# Altium footprint library Connectors.PcbLib: 122 footprints (part 2 of 8)
Each footprint in its own frame and in the unit in brackets; x right, y up, seen from the top. Pads: shape width x height; smd on the part's side, far side on the other; paste and mask are expansions set on the pad; w line width, h text height; cw(c..) or ccw(c..) is an arc to the next point about the centre after c.
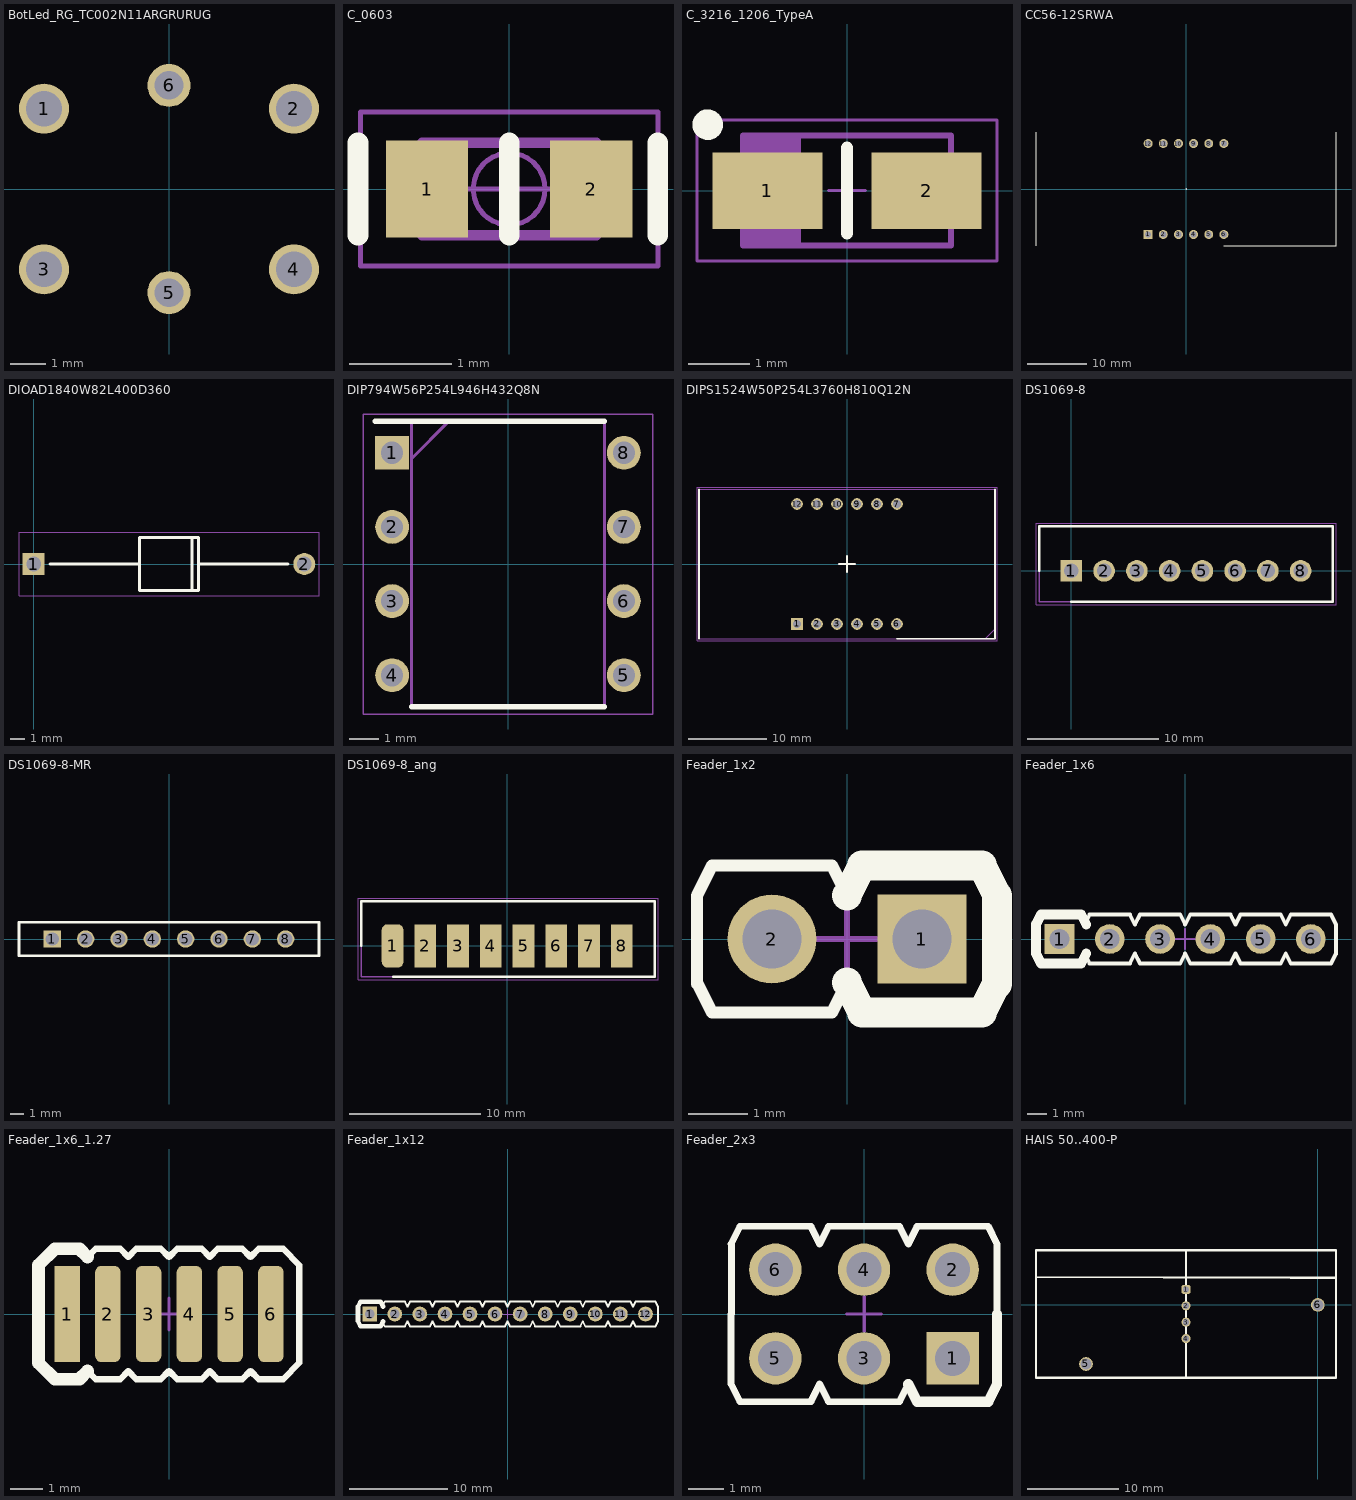
[diagram p1: the footprints below, top view; thin cyan lines are the x and y axes]

## BotLed_RG_TC002N11ARGRURUG [mm]
pads (6):
  round 1.401 hole 1: 1(-3.5,2.25) 2(3.5,2.25) 3(-3.5,-2.25) 4(3.5,-2.25)
  round 1.201 hole 0.8: 5(0,-2.9) 6(0,2.9)
3D body "TC002N11ARGRURUG.STEP": height 7.7, standoff -3.5, extent -5,-5 5,5

## C_0603 [mm] "Chip Capacitor, Body 1.0x0.55mm, IPC Medium Density"
height 0.5
pads (2):
  rect 0.8x0.95 smd: 1(-0.8,0) 2(0.8,0)
Top Overlay:
  lines w0.2: -1.473,-0.45 -1.473,0.45 ; 0,-0.45 0,0.45 ; 1.448,-0.45 1.448,0.45
Mechanical 14:
  lines w0.1: -0.85,-0.45 0.85,-0.45 0.85,0.45 -0.85,0.45 -0.85,-0.45
Mechanical 15:
  circle w0.05: c0,0 r0.35
  lines w0.05: -0.5,0 0.5,0 ; 0,-0.5 0,0.5 ; -1.45,-0.75 1.45,-0.75 1.45,0.75 -1.45,0.75 -1.45,-0.75
3D body "CAPC1608X100N.stp": height 1, standoff 0, extent -0.85,-0.45 0.85,0.45

## C_3216_1206_TypeA [mm] "Capacitor, Polarized, Molded  Body 3.2x1.6mm, IPC Medium Density"
height 1.8
pads (2):
  rect 1.8x1.25 smd: 1(-1.3,0) 2(1.3,0)
Top Overlay:
  circle w0.25: c-2.275,1.075 r0.125
  lines w0.2: 0,-0.7 0,0.7
Mechanical 14:
  lines w0.1: -1.625,-0.9 -1.625,0.9 ; -1.55,-0.9 -1.55,0.9 ; -1.475,-0.9 -1.475,0.9 ; -1.4,-0.9 -1.4,0.9 ; -1.325,-0.9 -1.325,0.9 ; -1.25,-0.9 -1.25,0.9 ; -1.175,-0.9 -1.175,0.9 ; -1.1,-0.9 -1.1,0.9 ; -1.025,-0.9 -1.025,0.9 ; -0.95,-0.9 -0.95,0.9 ; -0.875,-0.9 -0.875,0.9 ; -1.7,-0.9 1.7,-0.9 1.7,0.9 -1.7,0.9 -1.7,-0.9 ; -0.8,-0.9 -0.8,0.9 -0.8,-0.9
Mechanical 15:
  lines w0.05: -0.3,0 0.3,0 ; 0,-0.3 0,0.3 ; -2.45,-1.15 -2.45,1.15 2.45,1.15 2.45,-1.15 -2.45,-1.15
3D body "CAPMP3216X180N.stp": height 1.6, standoff 0, extent -1.7,-0.9 1.7,0.9

## CC56-12SRWA [mm] "Индикатор 14.2мм 4х7 красный ОК, 24мКд"
height 8.1
pads (12):
  rect 1.5x1.5 hole 1: 1(-6.35,-7.62)
  round 1.5 hole 1: 2(-3.81,-7.62) 3(-1.27,-7.62) 4(1.27,-7.62) 5(3.81,-7.62) 6(6.35,-7.62) 7(6.35,7.62) 8(3.81,7.62) 9(1.27,7.62) 10(-1.27,7.62) 11(-3.81,7.62) 12(-6.35,7.62)
Top Overlay:
  lines w0.2: -25.15,-9.5 -25.15,9.5 ; 6.35,-9.5 25.146,-9.5 25.146,9.5
  lines w0.254: 0,-0.01 0,0.01
3D body: height 0.25, standoff 0, extent -2.75,8.75 -2.75,8.75
3D body "CC56-12SRWA.STEP": height 8.1, standoff -1.5, extent -25.15,-9.5 25.15,9.5

## DIOAD1840W82L400D360 [mm]
pads (2):
  rect 1.5x1.5 hole 1: 1(0,0)
  round 1.5 hole 1: 2(18.4,0)
Top Overlay:
  lines w0.2: 1.1,0 7.2,0 ; 10.767,-1.8 10.767,1.8 ; 11.2,0 17.3,0 ; 7.2,-1.8 7.2,1.8 11.2,1.8 11.2,-1.8 7.2,-1.8
Mechanical 15:
  lines w0.05: -1,-2.15 -1,2.15 19.4,2.15 19.4,-2.15 -1,-2.15
3D body "BYV26C-TAP.stp": height 3.6, standoff -3.6, extent -0.408,-1.8 18.808,1.8

## DIP794W56P254L946H432Q8N [mm]
pads (8):
  rect 1.16x1.16 hole 0.76: 1(-3.97,3.81)
  round 1.16 hole 0.76: 2(-3.97,1.27) 3(-3.97,-1.27) 4(-3.97,-3.81) 5(3.97,-3.81) 6(3.97,-1.27) 7(3.97,1.27) 8(3.97,3.81)
Top Overlay:
  lines w0.2: -4.55,4.89 3.3,4.89 ; -3.3,-4.89 3.3,-4.89
Mechanical 13:
  lines w0.1: -3.3,3.62 -2.03,4.89 ; -3.3,-4.89 -3.3,4.89 3.3,4.89 3.3,-4.89 -3.3,-4.89
Mechanical 15:
  lines w0.05: -4.96,-5.14 -4.96,5.14 4.96,5.14 4.96,-5.14 -4.96,-5.14
3D body "MCP2551-E_P.stp": height 4.32, standoff -3.5, extent -4.11,-4.73 4.11,4.73

## DIPS1524W50P254L3760H810Q12N [mm]
pads (12):
  rect 1.5x1.5 hole 1: 1(-6.35,-7.62)
  round 1.5 hole 1: 2(-3.81,-7.62) 3(-1.27,-7.62) 4(1.27,-7.62) 5(3.81,-7.62) 6(6.35,-7.62) 7(6.35,7.62) 8(3.81,7.62) 9(1.27,7.62) 10(-1.27,7.62) 11(-3.81,7.62) 12(-6.35,7.62)
Top Overlay:
  lines w0.2: -18.8,-9.5 -18.8,9.5 ; 6.35,-9.5 18.8,-9.5 18.8,9.5
  lines w0.254: -1,0 1,0 ; 0,-1 0,1
Mechanical 13:
  lines w0.1: 17.53,-9.5 18.8,-8.23 ; -18.8,-9.5 18.8,-9.5 18.8,9.5 -18.8,9.5 -18.8,-9.5
Mechanical 15:
  lines w0.05: -19.05,-9.75 -19.05,9.75 19.05,9.75 19.05,-9.75 -19.05,-9.75
3D body: height 8.1, standoff 0, extent -18.796,-9.5 18.796,9.5

## DS1069-8 [mm]
pads (8):
  rect 1.65x1.65 hole 1.1: 1(0,0)
  round 1.65 hole 1.1: 2(2.5,0) 3(5,0) 4(7.5,0) 5(10,0) 6(12.5,0) 7(15,0) 8(17.5,0)
Top Overlay:
  lines w0.2: -2.45,0 -2.45,3.4 19.95,3.4 19.95,-2.35 0,-2.35
Mechanical 13:
  lines w0.1: -2.45,-2.35 -2.45,3.4 19.95,3.4 19.95,-2.35 -2.45,-2.35
Mechanical 15:
  lines w0.05: -2.7,-2.6 -2.7,3.65 20.2,3.65 20.2,-2.6 -2.7,-2.6
3D body "DS1069-8.stp": height 7.05, standoff -3.35, extent -2.45,-2.875 19.95,2.875

## DS1069-8-MR [mm]
pads (8):
  rect 1.301x1.301 hole 1: 1(-8.75,0)
  round 1.301 hole 1: 2(-6.25,0) 3(-3.75,0) 4(-1.25,0) 5(1.25,0) 6(3.75,0) 7(6.25,0) 8(8.75,0)
Top Overlay:
  lines w0.2: -11.25,-1.25 11.25,-1.25 11.25,1.25 -11.25,1.25 -11.25,-1.25
3D body "DS1069-8-MR.STEP": height 5.8, standoff -3.35, extent -11.2,-7.32 11.2,0.32

## DS1069-8_ang [mm]
pads (8):
  rrect50% 1.65x3.3 / inner rect 1.65x1.65 / far side rect 0x0 all layers, no hole: 1(-8.75,0)
  rect 1.65x3.3 / inner rect 1.65x3.3 / far side round 0 all layers, no hole: 2(-6.25,0)
  rect 1.65x3.3 / inner rect 1.65x3.3 / far side rect 0x0 all layers, no hole: 3(-3.75,0) 4(-1.25,0) 5(1.25,0) 6(3.75,0) 7(6.25,0) 8(8.75,0)
Top Overlay:
  lines w0.2: -11.137,0 -11.137,3.4 11.263,3.4 11.263,-2.35 -8.687,-2.35
Mechanical 13:
  lines w0.1: -11.137,-2.35 11.263,-2.35 11.263,3.4 -11.137,3.4 -11.137,-2.35
Mechanical 15:
  lines w0.05: -11.387,-2.6 11.513,-2.6 11.513,3.65 -11.387,3.65 -11.387,-2.6
3D body "DS1069-8.stp": height 3.37, standoff -2.38, extent -11.2,-9.5 11.2,0.9

## Feader_1x2 [mm] "4 Contacts - Pitch 2.54mm - Dual Row Through Mount Straight Header (Post Lead = 6.35mm, Tail Lead 3.05mm, Insulator 1.52mm)"
pads (2):
  rect 1.5x1.5 hole 1: 1(1.27,0)
  round 1.5 hole 1: 2(-1.27,0)
Top Overlay:
  lines w0.2: -2.54,-0.762 -2.54,0.737 -2.286,1.245 -0.254,1.245 0,0.737 ; -2.54,-0.737 -2.286,-1.245 -0.254,-1.245 0,-0.737 ; 0.254,1.245 2.286,1.245 ; 2.54,-0.762 2.54,0.737
  lines w0.5: 0,-0.737 0.254,-1.245 2.286,-1.245 2.54,-0.737 ; 0,0.737 0.254,1.245 2.286,1.245 2.54,0.737 2.54,-0.762
Mechanical 8:
  lines w0.1: -0.5,0 0,0 ; 0,-0.5 0,0 ; 0,0.5 0,0 ; 0.5,0 0,0
Mechanical 14:
  lines w0.1: -2.54,-0.762 -2.54,0.737 -2.286,1.245 -0.254,1.245 0,0.737 0.254,1.245 2.286,1.245 2.54,0.737 2.54,-0.762 ; -2.54,-0.737 -2.286,-1.245 -0.254,-1.245 0,-0.737 0.254,-1.245 2.286,-1.245 2.54,-0.737

## Feader_1x6 [mm] "6 Contacts - Pitch 2.54mm - Dual Row Through Mount Straight Header (Post Lead = 6.35mm, Tail Lead 3.05mm, Insulator 1.52mm)"
pads (6):
  rect 1.5x1.5 hole 1: 1(-6.35,0)
  round 1.5 hole 1: 2(-3.81,0) 3(-1.27,0) 4(1.27,0) 5(3.81,0) 6(6.35,0)
Top Overlay:
  lines w0.2: -5.08,-0.737 -4.826,-1.245 -2.794,-1.245 -2.54,-0.737 -2.286,-1.245 -0.254,-1.245 0,-0.737 0.254,-1.245 2.286,-1.245 2.54,-0.737 2.794,-1.245 4.826,-1.245 5.08,-0.737 5.334,-1.245 7.366,-1.245 7.62,-0.737 ; -5.08,0.737 -4.826,1.245 -2.794,1.245 -2.54,0.737 -2.286,1.245 -0.254,1.245 0,0.737 0.254,1.245 2.286,1.245 2.54,0.737 2.794,1.245 4.826,1.245 5.08,0.737 5.334,1.245 7.366,1.245 7.62,0.737 7.62,-0.762
  lines w0.5: -7.54,0.737 -7.286,1.245 -5.254,1.245 -5,0.737 ; -7.54,0.762 -7.54,-0.737 -7.286,-1.245 -5.254,-1.245 -5,-0.737
Mechanical 8:
  lines w0.1: -0.5,0 0,0 ; 0,-0.5 0,0 ; 0,0.5 0,0 ; 0.5,0 0,0

## Feader_1x6_1.27 [mm] "6 Contacts - Pitch 1.27mm - Dual Row Through Mount Straight Header (Post Lead = 6.35mm, Tail Lead 3.05mm, Insulator 1.52mm)"
pads (6):
  rect 0.8x3 smd: 1(-3.175,0)
  rrect50% 0.8x3 smd: 2(-1.905,0) 3(-0.635,0) 4(0.635,0) 5(1.905,0) 6(3.175,0)
Top Overlay:
  lines w0.2: -2.54,-1.778 -2.286,-2.032 -1.524,-2.032 -1.27,-1.778 -1.016,-2.032 -0.254,-2.032 0,-1.778 0.254,-2.032 1.016,-2.032 1.27,-1.778 1.524,-2.032 2.286,-2.032 2.54,-1.778 2.794,-2.032 3.556,-2.032 4.064,-1.524 4.064,0 4.064,1.524 3.556,2.032 2.794,2.032 2.54,1.778 2.286,2.032 1.524,2.032 1.27,1.778 1.016,2.032 0.254,2.032 0,1.778 -0.254,2.032 -1.016,2.032 -1.27,1.778 -1.524,2.032 -2.286,2.032 -2.54,1.778
  lines w0.4: -2.54,-1.778 -2.794,-2.032 -3.556,-2.032 -4.064,-1.524 -4.064,0 -4.064,1.524 -3.556,2.032 -2.794,2.032 -2.54,1.778
Mechanical 8:
  lines w0.1: 0,0.5 0,0 ; 0,0 0.5,0 0,0 ; 0,0 0,-0.5 0,0 ; 0,0 -0.5,0 0,0

## Feader_1x12 [mm] "6 Contacts - Pitch 2.54mm - Dual Row Through Mount Straight Header (Post Lead = 6.35mm, Tail Lead 3.05mm, Insulator 1.52mm)"
pads (12):
  rect 1.5x1.5 hole 1: 1(-13.97,0)
  round 1.5 hole 1: 2(-11.43,0) 3(-8.89,0) 4(-6.35,0) 5(-3.81,0) 6(-1.27,0) 7(1.27,0) 8(3.81,0) 9(6.35,0) 10(8.89,0) 11(11.43,0) 12(13.97,0)
Top Overlay:
  lines w0.2: -12.7,-0.737 -12.446,-1.245 -10.414,-1.245 -10.16,-0.737 -9.906,-1.245 -7.874,-1.245 -7.62,-0.737 -7.366,-1.245 -5.334,-1.245 -5.08,-0.737 -4.826,-1.245 -2.794,-1.245 -2.54,-0.737 -2.286,-1.245 -0.254,-1.245 0,-0.737 0.254,-1.245 2.286,-1.245 2.54,-0.737 2.794,-1.245 4.826,-1.245 5.08,-0.737 5.334,-1.245 7.366,-1.245 7.62,-0.737 7.874,-1.245 9.906,-1.245 10.16,-0.737 10.414,-1.245 12.446,-1.245 12.7,-0.737 12.954,-1.245 14.986,-1.245 15.24,-0.737 ; -12.7,0.737 -12.446,1.245 -10.414,1.245 -10.16,0.737 -9.906,1.245 -7.874,1.245 -7.62,0.737 -7.366,1.245 -5.334,1.245 -5.08,0.737 -4.826,1.245 -2.794,1.245 -2.54,0.737 -2.286,1.245 -0.254,1.245 0,0.737 0.254,1.245 2.286,1.245 2.54,0.737 2.794,1.245 4.826,1.245 5.08,0.737 5.334,1.245 7.366,1.245 7.62,0.737 7.874,1.245 9.906,1.245 10.16,0.737 10.414,1.245 12.446,1.245 12.7,0.737 12.954,1.245 14.986,1.245 15.24,0.737 15.24,-0.762
  lines w0.5: -15.16,0.737 -14.906,1.245 -12.874,1.245 -12.62,0.737 ; -15.16,0.762 -15.16,-0.737 -14.906,-1.245 -12.874,-1.245 -12.62,-0.737
Mechanical 8:
  lines w0.1: -0.5,0 0,0 ; 0,-0.5 0,0 ; 0,0.5 0,0 ; 0.5,0 0,0

## Feader_2x3 [mm] "6 Contacts - Pitch 2.54mm - Dual Row Through Mount Straight Header (Post Lead = 6.35mm, Tail Lead 3.05mm, Insulator 1.52mm)"
pads (6):
  rect 1.5x1.5 hole 1: 1(2.54,-1.27)
  round 1.5 hole 1: 2(2.54,1.27) 3(0,-1.27) 4(0,1.27) 5(-2.54,-1.27) 6(-2.54,1.27)
Top Overlay:
  lines w0.2: -3.81,-0.007 -3.81,-2.007 -3.556,-2.515 -1.524,-2.515 -1.27,-2.007 -1.016,-2.515 1.016,-2.515 1.27,-2.007 ; -3.81,2.007 -3.556,2.515 -1.524,2.515 -1.27,2.007 -1.016,2.515 1.016,2.515 1.27,2.007 1.524,2.515 3.556,2.515 3.81,2.007 3.81,0 ; -3.8,0 -3.8,2
  lines w0.3: 1.27,-2.007 1.524,-2.515 3.556,-2.515 3.81,-2.007 3.81,0
Mechanical 8:
  lines w0.1: -0.5,0 0,0 ; 0,-0.5 0,0 ; 0,0.5 0,0 ; 0.5,0 0,0
Mechanical 14:
  lines w0.1: 3.81,-2.007 3.81,2.007 ; 3.81,-2.007 3.556,-2.515 1.524,-2.515 1.27,-2.007 1.016,-2.515 -1.016,-2.515 -1.27,-2.007 -1.524,-2.515 -3.556,-2.515 -3.81,-2.007 -3.81,2.007 -3.556,2.515 -1.524,2.515 -1.27,2.007 -1.016,2.515 1.016,2.515 1.27,2.007 1.524,2.515 3.556,2.515 3.81,2.007 ; 3.81,-2.007 3.81,2.007

## HAIS 50..400-P [mm]
pads (6):
  rrect50% 1x1 hole 0.7: 1(-14.5,1.7)
  round 1 hole 0.7: 2(-14.5,-0.1) 3(-14.5,-1.9) 4(-14.5,-3.7)
  round 1.5 hole 1.2: 5(-25.5,-6.5) 6(0,0)
Top Overlay:
  lines w0.254: -31,3.072 -3,3 2,3.003 ; -14.5,1.7 -14.5,-0.1 -14.5,-1.9 -14.5,-3.7 -14.5,-8 -14.5,6 ; -31,-8 -31,6 2,6 2,-8 -31,-8
3D body "HAIS_3D.stp": height 3.5, standoff -29, extent -31,-8 2,6